# Altium footprint library Footprints.PcbLib: 236 footprints (part 5 of 15)
Each footprint in its own frame and in the unit in brackets; x right, y up, seen from the top. Pads: shape width x height; smd on the part's side, far side on the other; paste and mask are expansions set on the pad; w line width, h text height; cw(c..) or ccw(c..) is an arc to the next point about the centre after c.
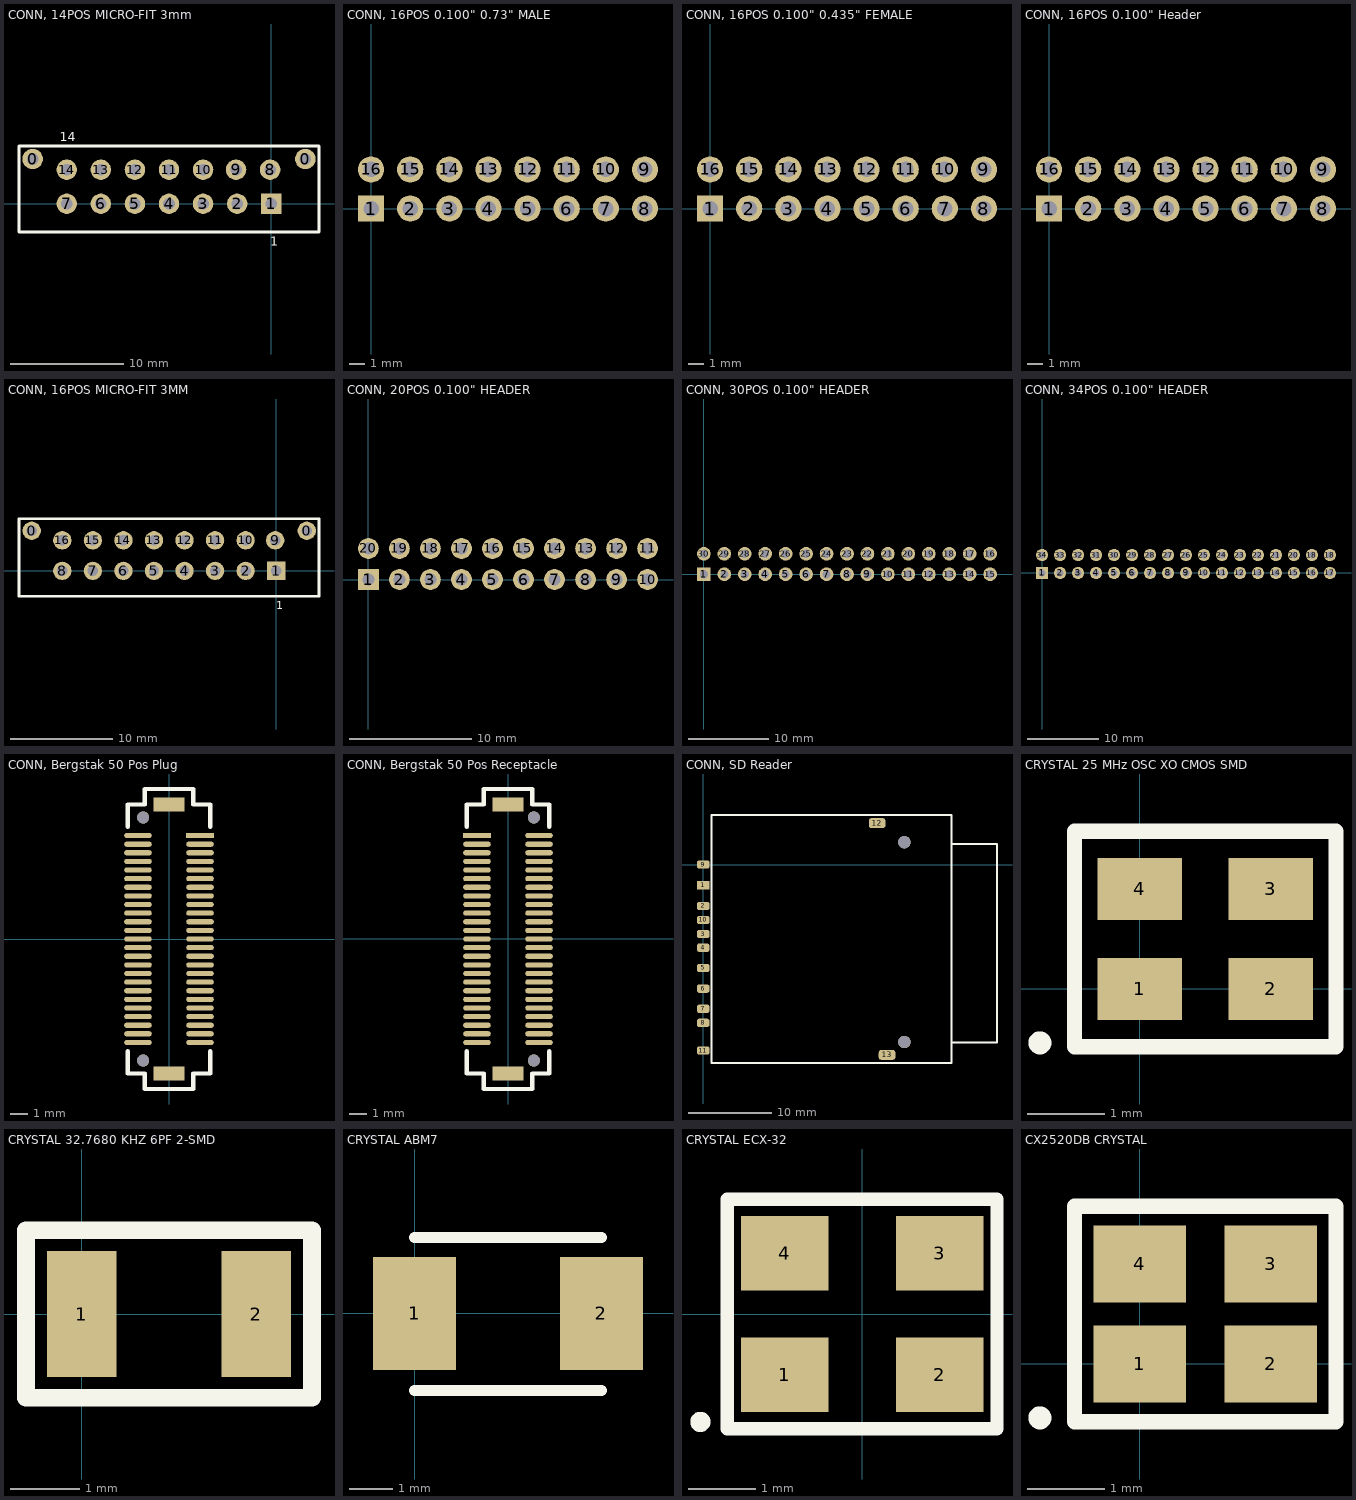
[diagram p4: the footprints below, top view; thin cyan lines are the x and y axes]

## CONN, 14POS MICRO-FIT 3mm [mm]
pads (16):
  round 1.8 hole 1.02: 0(-21,3.94) 0(3,3.94) 2(-3,0) 3(-6,0) 4(-9,0) 5(-12,0) 6(-15,0) 7(-18,0) 8(-0.1,3) 9(-3.1,3) 10(-6,3) 11(-9,3) 12(-12,3) 13(-15,3) 14(-18,3)
  rect 1.8x1.8 hole 1.02: 1(0,0)
Top Overlay:
  lines w0.254: -22.2,-2.5 -22.2,5.1 4.2,5.1 4.2,-2.5 -22.2,-2.5
  text "1" at -0.1,-3.7 h0.8
  text "14" at -18.6,5.5 h0.8
3D body "430451427.stp": height 9.95, standoff -3.14, extent -21.75,-2.485 3.4,6.285

## CONN, 16POS 0.100" 0.73" MALE [mm]
pads (16):
  rect 1.7x1.7 hole 1: 1(0,0)
  round 1.7 hole 1: 2(2.54,0) 3(5.08,0) 4(7.62,0) 5(10.16,0) 6(12.7,0) 7(15.24,0) 8(17.78,0) 9(17.78,2.54) 10(15.24,2.54) 11(12.7,2.54) 12(10.16,2.54) 13(7.62,2.54) 14(5.08,2.54) 15(2.54,2.54) 16(0,2.54)
3D body "TSW-108-15-T-D.stp": height 15.75, standoff -2.79, extent -1.27,-1.27 19.05,3.81

## CONN, 16POS 0.100" 0.435" FEMALE [mm]
pads (16):
  rect 1.7x1.7 hole 1: 1(0,0)
  round 1.7 hole 1: 2(2.54,0) 3(5.08,0) 4(7.62,0) 5(10.16,0) 6(12.7,0) 7(15.24,0) 8(17.78,0) 9(17.78,2.54) 10(15.24,2.54) 11(12.7,2.54) 12(10.16,2.54) 13(7.62,2.54) 14(5.08,2.54) 15(2.54,2.54) 16(0,2.54)
3D body "ESQ-108-12-T-D.stp": height 11.01, standoff -2.33, extent -1.524,-1.27 19.304,3.81

## CONN, 16POS 0.100" Header [mm]
pads (16):
  rect 1.7x1.7 hole 1: 1(0,0)
  round 1.7 hole 1: 2(2.54,0) 3(5.08,0) 4(7.62,0) 5(10.16,0) 6(12.7,0) 7(15.24,0) 8(17.78,0) 9(17.78,2.54) 10(15.24,2.54) 11(12.7,2.54) 12(10.16,2.54) 13(7.62,2.54) 14(5.08,2.54) 15(2.54,2.54) 16(0,2.54)

## CONN, 16POS MICRO-FIT 3MM [mm]
pads (18):
  round 1.8 hole 1.02: 0(-24,3.94) 0(3,3.94) 2(-3,0) 3(-6,0) 4(-9,0) 5(-12,0) 6(-15,0) 7(-18,0) 8(-21,0) 9(-0.1,3) 10(-3,3) 11(-6,3) 12(-9,3) 13(-12,3) 14(-15,3) 15(-18,3) 16(-21,3)
  rect 1.8x1.8 hole 1.02: 1(0,0)
Top Overlay:
  lines w0.254: -25.25,-2.5 4.2,-2.5 4.2,5.1 -25.25,5.1 -25.25,-2.5
  text "1" at 0,-3.75 h0.8
3D body "430451627.stp": height 9.95, standoff -3.14, extent -24.575,-2.52 3.575,6.25

## CONN, 20POS 0.100" HEADER [mm] "20 Position Header Connector 0.100\" (2.54mm) Through Hole Tin"
pads (20):
  rect 1.7x1.7 hole 1: 1(0,0)
  round 1.7 hole 1: 2(2.54,0) 3(5.08,0) 4(7.62,0) 5(10.16,0) 6(12.7,0) 7(15.24,0) 8(17.78,0) 9(20.32,0) 10(22.86,0) 11(22.86,2.54) 12(20.32,2.54) 13(17.78,2.54) 14(15.24,2.54) 15(12.7,2.54) 16(10.16,2.54) 17(7.62,2.54) 18(5.08,2.54) 19(2.54,2.54) 20(0,2.54)

## CONN, 30POS 0.100" HEADER [mm] "30 Position Header Connector 0.100\" (2.54mm) Through Hole Tin"
pads (30):
  rect 1.7x1.7 hole 1: 1(0,0)
  round 1.7 hole 1: 2(2.54,0) 3(5.08,0) 4(7.62,0) 5(10.16,0) 6(12.7,0) 7(15.24,0) 8(17.78,0) 9(20.32,0) 10(22.86,0) 11(25.4,0) 12(27.94,0) 13(30.48,0) 14(33.02,0) 15(35.56,0) 16(35.56,2.54) 17(33.02,2.54) 18(30.48,2.54) 19(27.94,2.54) 20(25.4,2.54) 21(22.86,2.54) 22(20.32,2.54) 23(17.78,2.54) 24(15.24,2.54) 25(12.7,2.54) 26(10.16,2.54) 27(7.62,2.54) 28(5.08,2.54) 29(2.54,2.54) 30(0,2.54)

## CONN, 34POS 0.100" HEADER [mm] "34 Position Header Connector 0.100\" (2.54mm) Through Hole Tin"
pads (34):
  rect 1.7x1.7 hole 1: 1(0,0)
  round 1.7 hole 1: 2(2.54,0) 3(5.08,0) 4(7.62,0) 5(10.16,0) 6(12.7,0) 7(15.24,0) 8(17.78,0) 9(20.32,0) 10(22.86,0) 11(25.4,0) 12(27.94,0) 13(30.48,0) 14(33.02,0) 15(35.56,0) 16(38.1,0) 17(40.64,0) 18(38.1,2.54) 18(40.64,2.54) 20(35.56,2.54) 21(33.02,2.54) 22(30.48,2.54) 23(27.94,2.54) 24(25.4,2.54) 25(22.86,2.54) 26(20.32,2.54) 27(17.78,2.54) 28(15.24,2.54) 29(12.7,2.54) 30(10.16,2.54) 31(7.62,2.54) 32(5.08,2.54) 33(2.54,2.54) 34(0,2.54)

## CONN, Bergstak 50 Pos Plug [mm] "Bergstak 50 Position Plug"
pads (54):
  rect 1.6x0.3 smd: 1(1.8,6)
  oval 1.6x0.3 smd: 2(1.8,5.5) 3(1.8,5) 4(1.8,4.5) 5(1.8,4) 6(1.8,3.5) 7(1.8,3) 8(1.8,2.5) 9(1.8,2) 10(1.8,1.5) 11(1.8,1) 12(1.8,0.5) 13(1.8,0) 14(1.8,-0.5) 15(1.8,-1) 16(1.8,-1.5) 17(1.8,-2) 18(1.8,-2.5) 19(1.8,-3) 20(1.8,-3.5) 21(1.8,-4) 22(1.8,-4.5) 23(1.8,-5) 24(1.8,-5.5) 25(1.8,-6) 26(-1.8,-6) 27(-1.8,-5.5) 28(-1.8,-5) 29(-1.8,-4.5) 30(-1.8,-4) 31(-1.8,-3.5) 32(-1.8,-3) 33(-1.8,-2.5) 34(-1.8,-2) 35(-1.8,-1.5) 36(-1.8,-1) 37(-1.8,-0.5) 38(-1.8,0) 39(-1.8,0.5) 40(-1.8,1) 41(-1.8,1.5) 42(-1.8,2) 43(-1.8,2.5) 44(-1.8,3) 45(-1.8,3.5) 46(-1.8,4) 47(-1.8,4.5) 48(-1.8,5) 49(-1.8,5.5) 50(-1.8,6)
  round 0.7 hole 0.7: ""(-1.5,-7.05) ""(-1.5,7.05)
  rect 1.8x0.8 smd: ""(0,-7.8) ""(0,7.8)
Top Overlay:
  lines w0.254: -2.4,-6.5 -2.4,-7.8 -1.4,-7.8 -1.4,-8.7 1.4,-8.7 1.4,-7.8 2.4,-7.8 2.4,-6.5 ; -2.4,6.5 -2.4,7.8 -1.4,7.8 -1.4,8.7 1.4,8.7 1.4,7.8 2.4,7.8 2.4,6.5
3D body "10132797-055100LF.stp": height 4.2, standoff -0.6, extent -2.3,-7.75 2.3,7.75

## CONN, Bergstak 50 Pos Receptacle [mm] "Bergstak 50 Position Receptacle"
height 2.7
pads (54):
  rect 1.6x0.3 smd: 1(-1.8,6)
  oval 1.6x0.3 smd: 2(-1.8,5.5) 3(-1.8,5) 4(-1.8,4.5) 5(-1.8,4) 6(-1.8,3.5) 7(-1.8,3) 8(-1.8,2.5) 9(-1.8,2) 10(-1.8,1.5) 11(-1.8,1) 12(-1.8,0.5) 13(-1.8,0) 14(-1.8,-0.5) 15(-1.8,-1) 16(-1.8,-1.5) 17(-1.8,-2) 18(-1.8,-2.5) 19(-1.8,-3) 20(-1.8,-3.5) 21(-1.8,-4) 22(-1.8,-4.5) 23(-1.8,-5) 24(-1.8,-5.5) 25(-1.8,-6) 26(1.8,-6) 27(1.8,-5.5) 28(1.8,-5) 29(1.8,-4.5) 30(1.8,-4) 31(1.8,-3.5) 32(1.8,-3) 33(1.8,-2.5) 34(1.8,-2) 35(1.8,-1.5) 36(1.8,-1) 37(1.8,-0.5) 38(1.8,0) 39(1.8,0.5) 40(1.8,1) 41(1.8,1.5) 42(1.8,2) 43(1.8,2.5) 44(1.8,3) 45(1.8,3.5) 46(1.8,4) 47(1.8,4.5) 48(1.8,5) 49(1.8,5.5) 50(1.8,6)
  rect 1.8x0.8 smd: ""(0,-7.8) ""(0,7.8)
  round 0.7 hole 0.7: ""(1.5,-7.05) ""(1.5,7.05)
Top Overlay:
  lines w0.254: -2.4,-6.5 -2.4,-7.8 -1.4,-7.8 -1.4,-8.7 1.4,-8.7 1.4,-7.8 2.4,-7.8 2.4,-6.5 ; -2.4,6.5 -2.4,7.8 -1.4,7.8 -1.4,8.7 1.4,8.7 1.4,7.8 2.4,7.8 2.4,6.5
3D body "10132798-052100LF.stp": height 2.6, standoff -0.6, extent -2.3,-7.75 2.3,7.75

## CONN, SD Reader [mm] "101-00313-68-02CT-ND"
pads (15):
  rect 1.5x1 smd: 1(0,-2.5)
  rrect50% 1.5x1 smd: 2(0,-5) 3(0,-8.4) 4(0,-10.05) 5(0,-12.5) 6(0,-15) 7(0,-17.43) 8(0,-19.13) 9(0,0) 10(0,-6.7) 11(0,-22.48)
  rrect50% 2x1.2 smd: 12(21.01,5) 13(22.21,-23)
  round 1.5 hole 1.5: ""(24.31,-21.45) ""(24.31,2.7)
Top Overlay:
  lines w0.254: 1,-23.5 1,6 30,6 30,-24 1,-24 1,-23 ; 30,-21.5 35.5,-21.5 35.5,2.5 30,2.5

## CRYSTAL 25 MHz OSC XO CMOS SMD [mm]
pads (4):
  rect 1.1x0.8 smd: 1(0,0) 2(1.7,0) 3(1.7,1.3) 4(0,1.3)
Top Overlay:
  circle w0.2: c-1.3,-0.7 r0.05
  lines w0.2: -0.85,-0.75 2.55,-0.75 2.55,2.05 -0.85,2.05 -0.85,-0.75
3D body: height 0.5, standoff 0, extent -0.4,-0.35 2.1,1.65

## CRYSTAL 32.7680 KHZ 6PF 2-SMD [mm]
pads (2):
  rect 1x1.8 smd: 1(0,0) 2(2.5,0)
Top Overlay:
  lines w0.254: -0.8,-1.2 3.3,-1.2 3.3,1.2 -0.8,1.2 -0.8,-1.2
3D body "NX3215SA.step": height 0.8, standoff 0, extent -0.35,-0.75 2.85,0.75

## CRYSTAL ABM7 [mm] "32MHz ?0ppm Crystal 18pF 50 Ohms 2-SMD, No Lead"
height 1.4
pads (2):
  rect 1.9x2.6 smd: 1(0,0) 2(4.3,0)
Top Overlay:
  lines w0.254: 0,-1.777 4.3,-1.777 ; 0,1.75 4.3,1.75
3D body "ABM7.STEP": height 1.4, standoff 0, extent -0.822,-1.777 5.172,1.728

## CRYSTAL ECX-32 [mm]
pads (4):
  rect 1.3x1.1 smd: 1(-1.15,-0.9) 2(1.15,-0.9) 3(1.15,0.9) 4(-1.15,0.9)
Top Overlay:
  circle w0.2: c-2.4,-1.6 r0.05
  lines w0.2: -2,-1.7 2,-1.7 2,1.7 -2,1.7 -2,-1.7
3D body "ABM8.STEP": height 0.8, standoff 0, extent -1.6,-1.244 1.6,1.245

## CX2520DB CRYSTAL [mm]
pads (4):
  rect 1.2x1 smd: 1(0,0) 2(1.7,0) 3(1.7,1.3) 4(0,1.3)
Top Overlay:
  circle w0.2: c-1.3,-0.7 r0.05
  lines w0.2: -0.85,-0.75 2.55,-0.75 2.55,2.05 -0.85,2.05 -0.85,-0.75
3D body: height 0.5, standoff 0, extent -0.4,-0.35 2.1,1.65